# Altium schematic symbol library 6-Connectors 连接器.端子.SchLib: 402 symbols (part 4 of 5) (continued)
## HARTING_16 33 096 1201 000 (continued)

## HARTING_16 79 000 0020 000
designator J?
Quad Length (22.5mm) Stacking Pin For 1x AdvancedMC Basic Side + 2x MCH-Plug Basic Side + 1x Piggyback Connector (Basic Side)
text: Stacking Pin

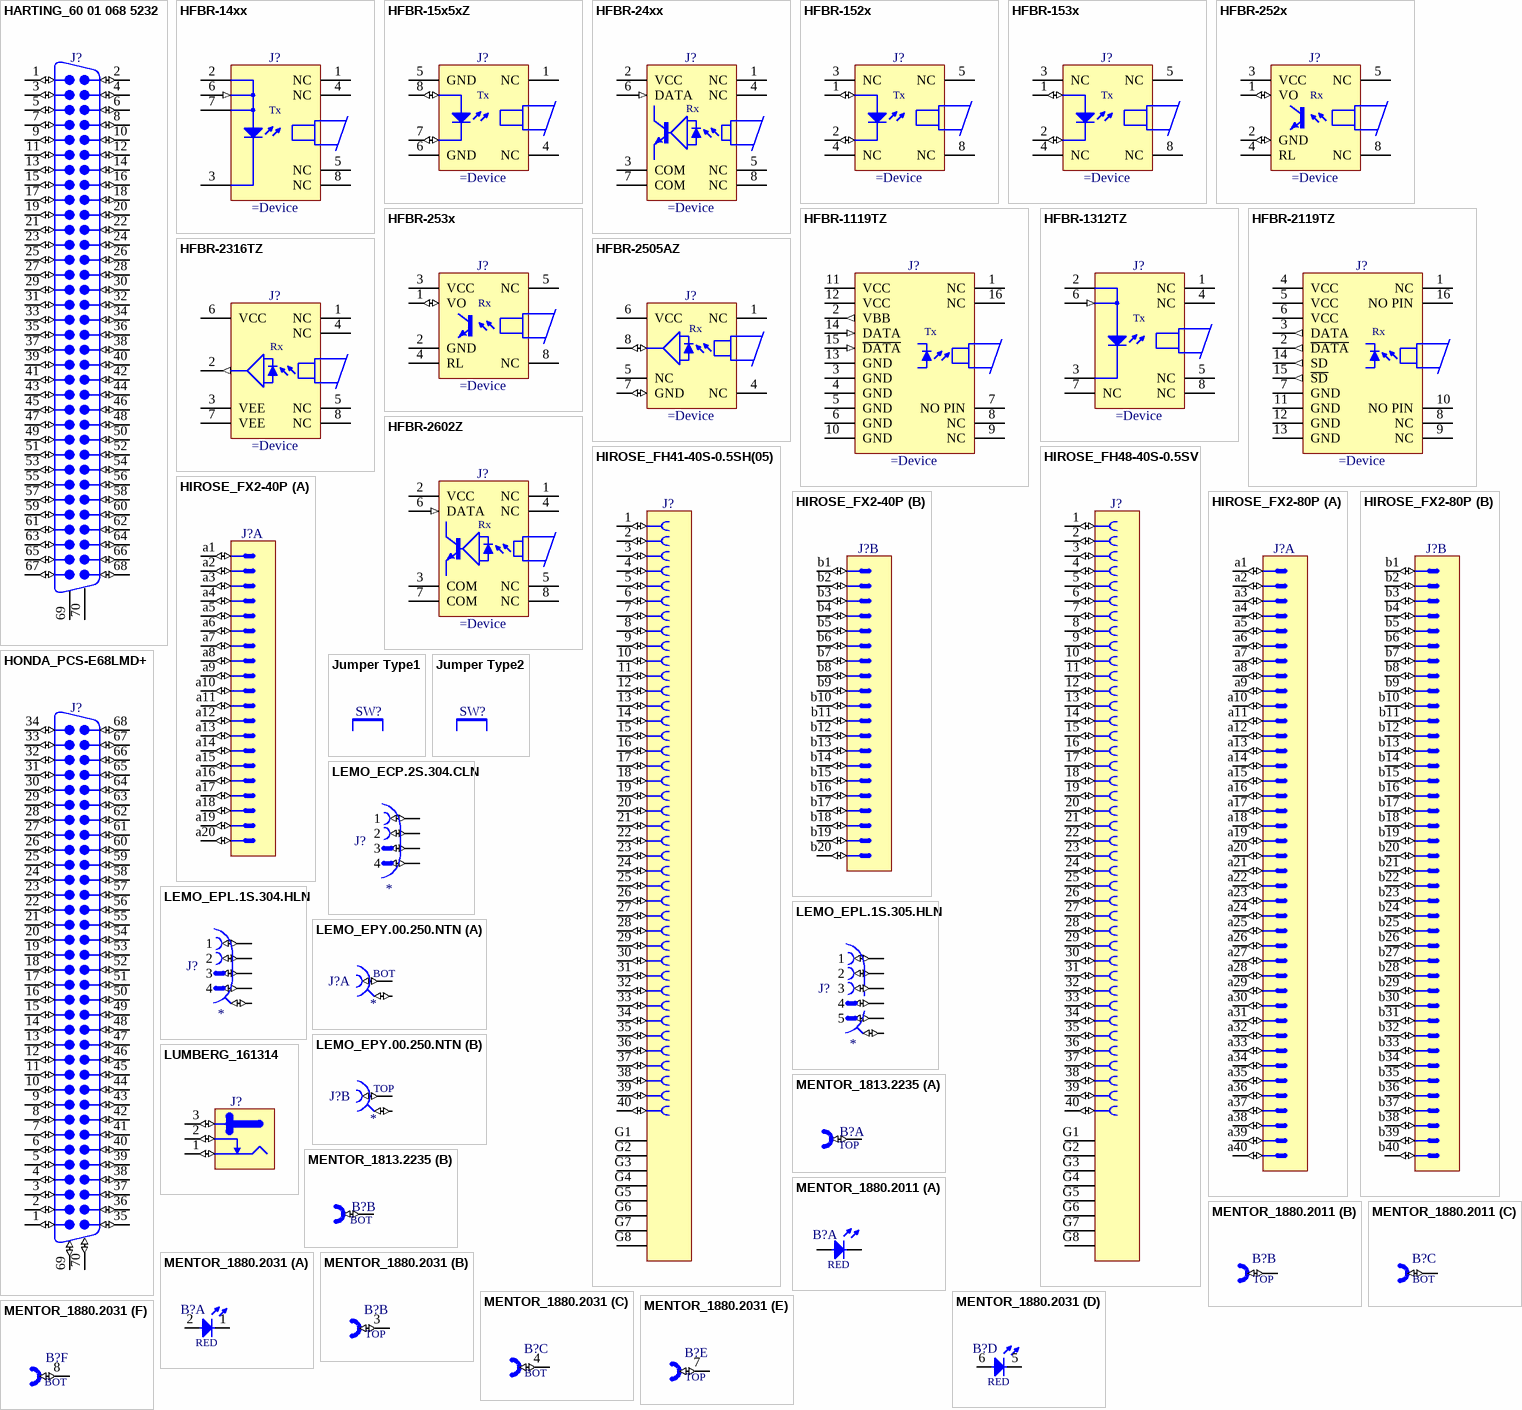
[diagram p38: symbols HARTING_60 01 068 5232 to MENTOR_1880.2031]

## HARTING_60 01 068 5232
designator J?
68 Positions, Right Angle HAR-MIK Male Connector, Panel Fixing M2.5 / PCB Fixing M2.5
pins: 1 (io), 2 (io), 3 (io), 4 (io), 5 (io), 6 (io), 7 (io), 8 (io), 9 (io), 10 (io), 11 (io), 12 (io), 13 (io), 14 (io), 15 (io), 16 (io), 17 (io), 18 (io), 19 (io), 20 (io), 21 (io), 22 (io), 23 (io), 24 (io), 25 (io), 26 (io), 27 (io), 28 (io), 29 (io), 30 (io), 31 (io), 32 (io), 33 (io), 34 (io), 35 (io), 36 (io), 37 (io), 38 (io), 39 (io), 40 (io), 41 (io), 42 (io), 43 (io), 44 (io), 45 (io), 46 (io), 47 (io), 48 (io), 49 (io), 50 (io), 51 (io), 52 (io), 53 (io), 54 (io), 55 (io), 56 (io), 57 (io), 58 (io), 59 (io), 60 (io), 61 (io), 62 (io), 63 (io), 64 (io), 65 (io), 66 (io), 67 (io), 68 (io), 69, 70
1 alternate drawing of the same symbol

## HFBR-14xx
designator J?
HFBR-0400Z Series, Fiber Optic Transmitter
pins: 1 NC, 2 A (power), 3 C (power), 4 NC, 5 NC, 6 A (in), 7 A (power), 8 NC
text: Tx

## HFBR-15x5xZ
designator J?
HFBR-1505xZ, HFBR-1515xZ Series, Fiber Optic Transmitter
pins: 1 NC, 4 NC, 5 GND (power), 6 GND (power), 7 C (io), 8 A (io)
text: Tx

## HFBR-24xx
designator J?
HFBR-0400Z Series, Fiber Optic Receiver
pins: 1 NC, 2 VCC (power), 3 COM (power), 4 NC, 5 NC, 6 DATA (in), 7 COM (power), 8 NC
text: Rx

## HFBR-152x
designator J?
HFBR-0500Z Series, Fiber Optic Transmitter
pins: 1 A (io), 2 C (io), 3 NC, 4 NC, 5 NC, 8 NC
text: Tx

## HFBR-153x
designator J?
HFBR-0500Z Series, Fiber Optic Transmitter
pins: 1 A (io), 2 C (io), 3 NC, 4 NC, 5 NC, 8 NC
text: Tx

## HFBR-252x
designator J?
HFBR-0500Z Series, Fiber Optic Receiver
pins: 1 VO (io), 2 GND (io), 3 VCC (power), 4 RL, 5 NC, 8 NC
text: Rx

## HFBR-253x
designator J?
HFBR-0500Z Series, Fiber Optic Receiver
pins: 1 VO (io), 2 GND (power), 3 VCC (power), 4 RL, 5 NC, 8 NC
text: Rx

## HFBR-1119TZ
designator J?
266MBd, 1300 nm Fiber Optic Transmitter Data Link
pins: 1 NC, 2 VBB (out), 3 GND (power), 4 GND (power), 5 GND (power), 6 GND (power), 7 NO PIN, 8 NC, 9 NC, 10 GND (power), 11 VCC (power), 12 VCC (power), 13 GND (power), 14 DATA (in), 15 ~{DATA} (in), 16 NC
text: Tx

## HFBR-1312TZ
designator J?
HFBR-0300Z Series, 155Mbps, 1300 nm Fiber Optic Transmitter
pins: 1 NC, 2 A (power), 3 C (power), 4 NC, 5 NC, 6 A (in), 7 NC, 8 NC
text: Tx

## HFBR-2119TZ
designator J?
266MBd, 1300 nm Fiber Optic Receiver Data Link
pins: 1 NC, 2 ~{DATA} (out), 3 DATA (out), 4 VCC (power), 5 VCC (power), 6 VCC (power), 7 GND (power), 8 NC, 9 NC, 10 NO PIN, 11 GND (power), 12 GND (power), 13 GND (power), 14 SD (out), 15 ~{SD} (out), 16 NO PIN
text: Rx

## HFBR-2316TZ
designator J?
HFBR-0300Z Series, 155Mbps, 1300 nm Fiber Optic Receiver
pins: 1 NC, 2 SIG (out), 3 VEE (power), 4 NC, 5 NC, 6 VCC (power), 7 VEE (power), 8 NC
text: Rx

## HFBR-2505AZ
designator J?
Fiber Optic Receiver
pins: 1 NC, 4 NC, 5 NC, 6 VCC (power), 7 GND (io), 8 VO (io)
text: Rx

## HFBR-2602Z
designator J?
HFBR-2602Z Fiber Optic Receiver
pins: 1 NC, 2 VCC (power), 3 COM (power), 4 NC, 5 NC, 6 DATA (in), 7 COM (power), 8 NC
text: Rx

## HIROSE_FH41-40S-0.5SH(05)
designator J?
40 Contacts, 0.5mm Pitch, 2.5mm, Horizontal Mounting, High Speed Transmission Connector for Shielded FFC, FH41 Serie
pins: 1 (io), 2 (io), 3 (io), 4 (io), 5 (io), 6 (io), 7 (io), 8 (io), 9 (io), 10 (io), 11 (io), 12 (io), 13 (io), 14 (io), 15 (io), 16 (io), 17 (io), 18 (io), 19 (io), 20 (io), 21 (io), 22 (io), 23 (io), 24 (io), 25 (io), 26 (io), 27 (io), 28 (io), 29 (io), 30 (io), 31 (io), 32 (io), 33 (io), 34 (io), 35 (io), 36 (io), 37 (io), 38 (io), 39 (io), 40 (io), G1 (power), G2 (power), G3 (power), G4 (power), G5 (power), G6 (power), G7 (power), G8 (power)

## HIROSE_FH48-40S-0.5SV
designator J?
40 Contacts, 0.5mm Pitch, 2.5mm, Vertical Mounting, High Speed Transmission Connector for Shielded FFC
pins: 1 (io), 2 (io), 3 (io), 4 (io), 5 (io), 6 (io), 7 (io), 8 (io), 9 (io), 10 (io), 11 (io), 12 (io), 13 (io), 14 (io), 15 (io), 16 (io), 17 (io), 18 (io), 19 (io), 20 (io), 21 (io), 22 (io), 23 (io), 24 (io), 25 (io), 26 (io), 27 (io), 28 (io), 29 (io), 30 (io), 31 (io), 32 (io), 33 (io), 34 (io), 35 (io), 36 (io), 37 (io), 38 (io), 39 (io), 40 (io), G1 (power), G2 (power), G3 (power), G4 (power), G5 (power), G6 (power), G7 (power), G8 (power)

## HIROSE_FX2-40P
designator J?
40 Contacts, 1.27mm Pitch, Board to Board & Mezzanine Header with Prefixed Pin
part A pins: a1 (io), a2 (io), a3 (io), a4 (io), a5 (io), a6 (io), a7 (io), a8 (io), a9 (io), a10 (io), a11 (io), a12 (io), a13 (io), a14 (io), a15 (io), a16 (io), a17 (io), a18 (io), a19 (io), a20 (io)
part B pins: b1 (io), b2 (io), b3 (io), b4 (io), b5 (io), b6 (io), b7 (io), b8 (io), b9 (io), b10 (io), b11 (io), b12 (io), b13 (io), b14 (io), b15 (io), b16 (io), b17 (io), b18 (io), b19 (io), b20 (io)

## HIROSE_FX2-80P
designator J?
80 Contacts, 1.27mm Pitch, Board to Board & Mezzanine Header with Prefixed Pin
part A pins: a1 (io), a2 (io), a3 (io), a4 (io), a5 (io), a6 (io), a7 (io), a8 (io), a9 (io), a10 (io), a11 (io), a12 (io), a13 (io), a14 (io), a15 (io), a16 (io), a17 (io), a18 (io), a19 (io), a20 (io), a21 (io), a22 (io), a23 (io), a24 (io), a25 (io), a26 (io), a27 (io), a28 (io), a29 (io), a30 (io), a31 (io), a32 (io), a33 (io), a34 (io), a35 (io), a36 (io), a37 (io), a38 (io), a39 (io), a40 (io)
part B pins: b1 (io), b2 (io), b3 (io), b4 (io), b5 (io), b6 (io), b7 (io), b8 (io), b9 (io), b10 (io), b11 (io), b12 (io), b13 (io), b14 (io), b15 (io), b16 (io), b17 (io), b18 (io), b19 (io), b20 (io), b21 (io), b22 (io), b23 (io), b24 (io), b25 (io), b26 (io), b27 (io), b28 (io), b29 (io), b30 (io), b31 (io), b32 (io), b33 (io), b34 (io), b35 (io), b36 (io), b37 (io), b38 (io), b39 (io), b40 (io)

## HONDA_PCS-E68LMD+
designator J?
1.27mm Pitch Connector, 68 Male Contacts, Right-Angle, PCS Series
pins: 1 (io), 2 (io), 3 (io), 4 (io), 5 (io), 6 (io), 7 (io), 8 (io), 9 (io), 10 (io), 11 (io), 12 (io), 13 (io), 14 (io), 15 (io), 16 (io), 17 (io), 18 (io), 19 (io), 20 (io), 21 (io), 22 (io), 23 (io), 24 (io), 25 (io), 26 (io), 27 (io), 28 (io), 29 (io), 30 (io), 31 (io), 32 (io), 33 (io), 34 (io), 35 (io), 36 (io), 37 (io), 38 (io), 39 (io), 40 (io), 41 (io), 42 (io), 43 (io), 44 (io), 45 (io), 46 (io), 47 (io), 48 (io), 49 (io), 50 (io), 51 (io), 52 (io), 53 (io), 54 (io), 55 (io), 56 (io), 57 (io), 58 (io), 59 (io), 60 (io), 61 (io), 62 (io), 63 (io), 64 (io), 65 (io), 66 (io), 67 (io), 68 (io), 69 (io), 70 (io)
1 alternate drawing of the same symbol

## Jumper Type1
designator SW?  (value not drawn)
Jumper 1 Pin
pins: 1 (io)

## Jumper Type2
designator SW?  (value not drawn)
Jumper 2 pins
pins: 1 (io), 2 (io)

## LEMO_ECP.2S.304.CLN
designator J?
Coax 2 Female (1-2) + 2 Male (3-4)_No Shield
pins: 1 (io), 2 (io), 3 (io), 4 (io)

## LEMO_EPL.1S.304.HLN
designator J?
Coax 2 Female + 2 Male + 1 Shield
pins: 1 (io), 2 (io), 3 (io), 4 (io), 5 (io)

## LEMO_EPL.1S.305.HLN
designator J?
Coax 3 Female + 2 Male + 1 Shield
pins: 1 (io), 2 (io), 3 (io), 4 (io), 5 (io), 6 (io)

## LEMO_EPY.00.250.NTN
designator J?
Dual Female Coax 1-2 Common Shield 3
part A pins: 1 (io), 3 (io)
part B pins: 2 (io), 3 (io)
part A text: BOT
part B text: TOP

## LUMBERG_161314
designator J?
24V /3. 5A, 2.1mm Diameter Pin, SMD DC Power Supply Connector With  Break Contact
pins: 1 (io), 2 (io), 3 (io)

## MENTOR_1813.2235
designator B?
2 x Right Angled Test Jack 2mm
part A pins: 1 (io)
part B pins: 2 (io)
part A text: TOP
part B text: BOT

## MENTOR_1880.2011
designator B?
2 x TEST JACK 2mm + 1 x RED LED 3mm PCB EDGE MOUNTING
part A pins: 1 C, 2 A
part B pins: 3 (io)
part C pins: 4 (io)
part A text: RED
part B text: TOP
part C text: BOT

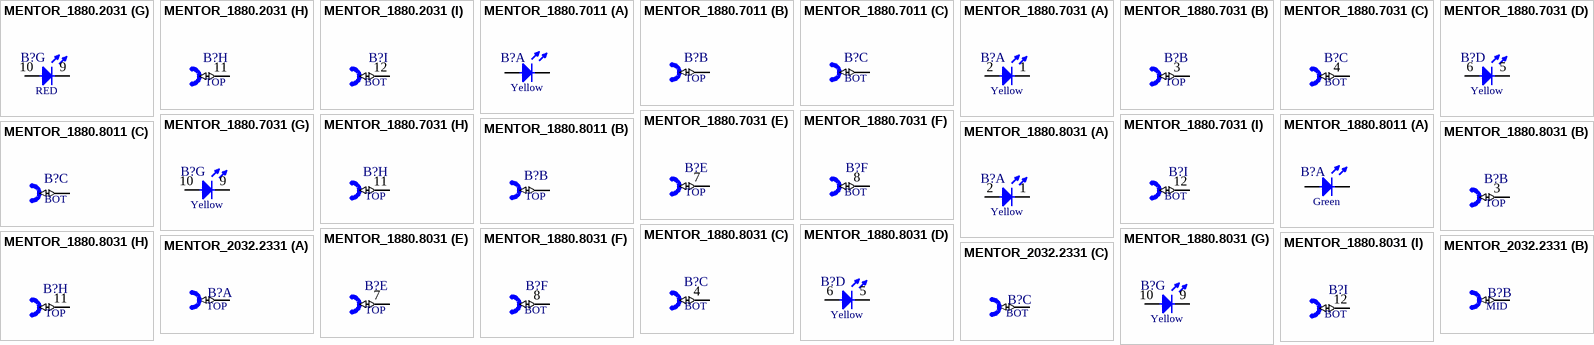
[diagram p39: symbols MENTOR_1880.2031 to MENTOR_2032.2331]

## MENTOR_1880.2031
designator B?
6 x Test JACK 2mm + 3 x Red LED 3mm PCB Edge Mounting
part A pins: 1 C, 2 A
part B pins: 3 (io)
part C pins: 4 (io)
part D pins: 5 C, 6 A
part E pins: 7 (io)
part F pins: 8 (io)
part G pins: 9 C, 10 A
part H pins: 11 (io)
part I pins: 12 (io)
part A text: RED
part B text: TOP
part C text: BOT
part D text: RED
part E text: TOP
part F text: BOT
part G text: RED
part H text: TOP
part I text: BOT

## MENTOR_1880.7011
designator B?
2 x TEST JACK 2mm + 1 x Yellow LED 3mm PCB EDGE MOUNTING
part A pins: 1 C, 2 A
part B pins: 3 (io)
part C pins: 4 (io)
part A text: Yellow
part B text: TOP
part C text: BOT

## MENTOR_1880.7031
designator B?
6 x Test JACK 2mm + 3 x Yellow LED 3mm PCB Edge Mounting
part A pins: 1 C, 2 A
part B pins: 3 (io)
part C pins: 4 (io)
part D pins: 5 C, 6 A
part E pins: 7 (io)
part F pins: 8 (io)
part G pins: 9 C, 10 A
part H pins: 11 (io)
part I pins: 12 (io)
part A text: Yellow
part B text: TOP
part C text: BOT
part D text: Yellow
part E text: TOP
part F text: BOT
part G text: Yellow
part H text: TOP
part I text: BOT

## MENTOR_1880.8011
designator B?
2 x TEST JACK 2mm + 1 x Green LED 3mm PCB EDGE MOUNTING
part A pins: 1 C, 2 A
part B pins: 3 (io)
part C pins: 4 (io)
part A text: Green
part B text: TOP
part C text: BOT

## MENTOR_1880.8031
designator B?
6 x Test JACK 2mm + 3 x Green LED 3mm PCB Edge Mounting
part A pins: 1 C, 2 A
part B pins: 3 (io)
part C pins: 4 (io)
part D pins: 5 C, 6 A
part E pins: 7 (io)
part F pins: 8 (io)
part G pins: 9 C, 10 A
part H pins: 11 (io)
part I pins: 12 (io)
part A text: Yellow
part B text: TOP
part C text: BOT
part D text: Yellow
part E text: TOP
part F text: BOT
part G text: Yellow
part H text: TOP
part I text: BOT

## MENTOR_2032.2331
designator B?
3 x Right Angled Test Jack 2mm
part A pins: 1 (io)
part B pins: 2 (io)
part C pins: 3 (io)
part A text: TOP
part B text: MID
part C text: BOT

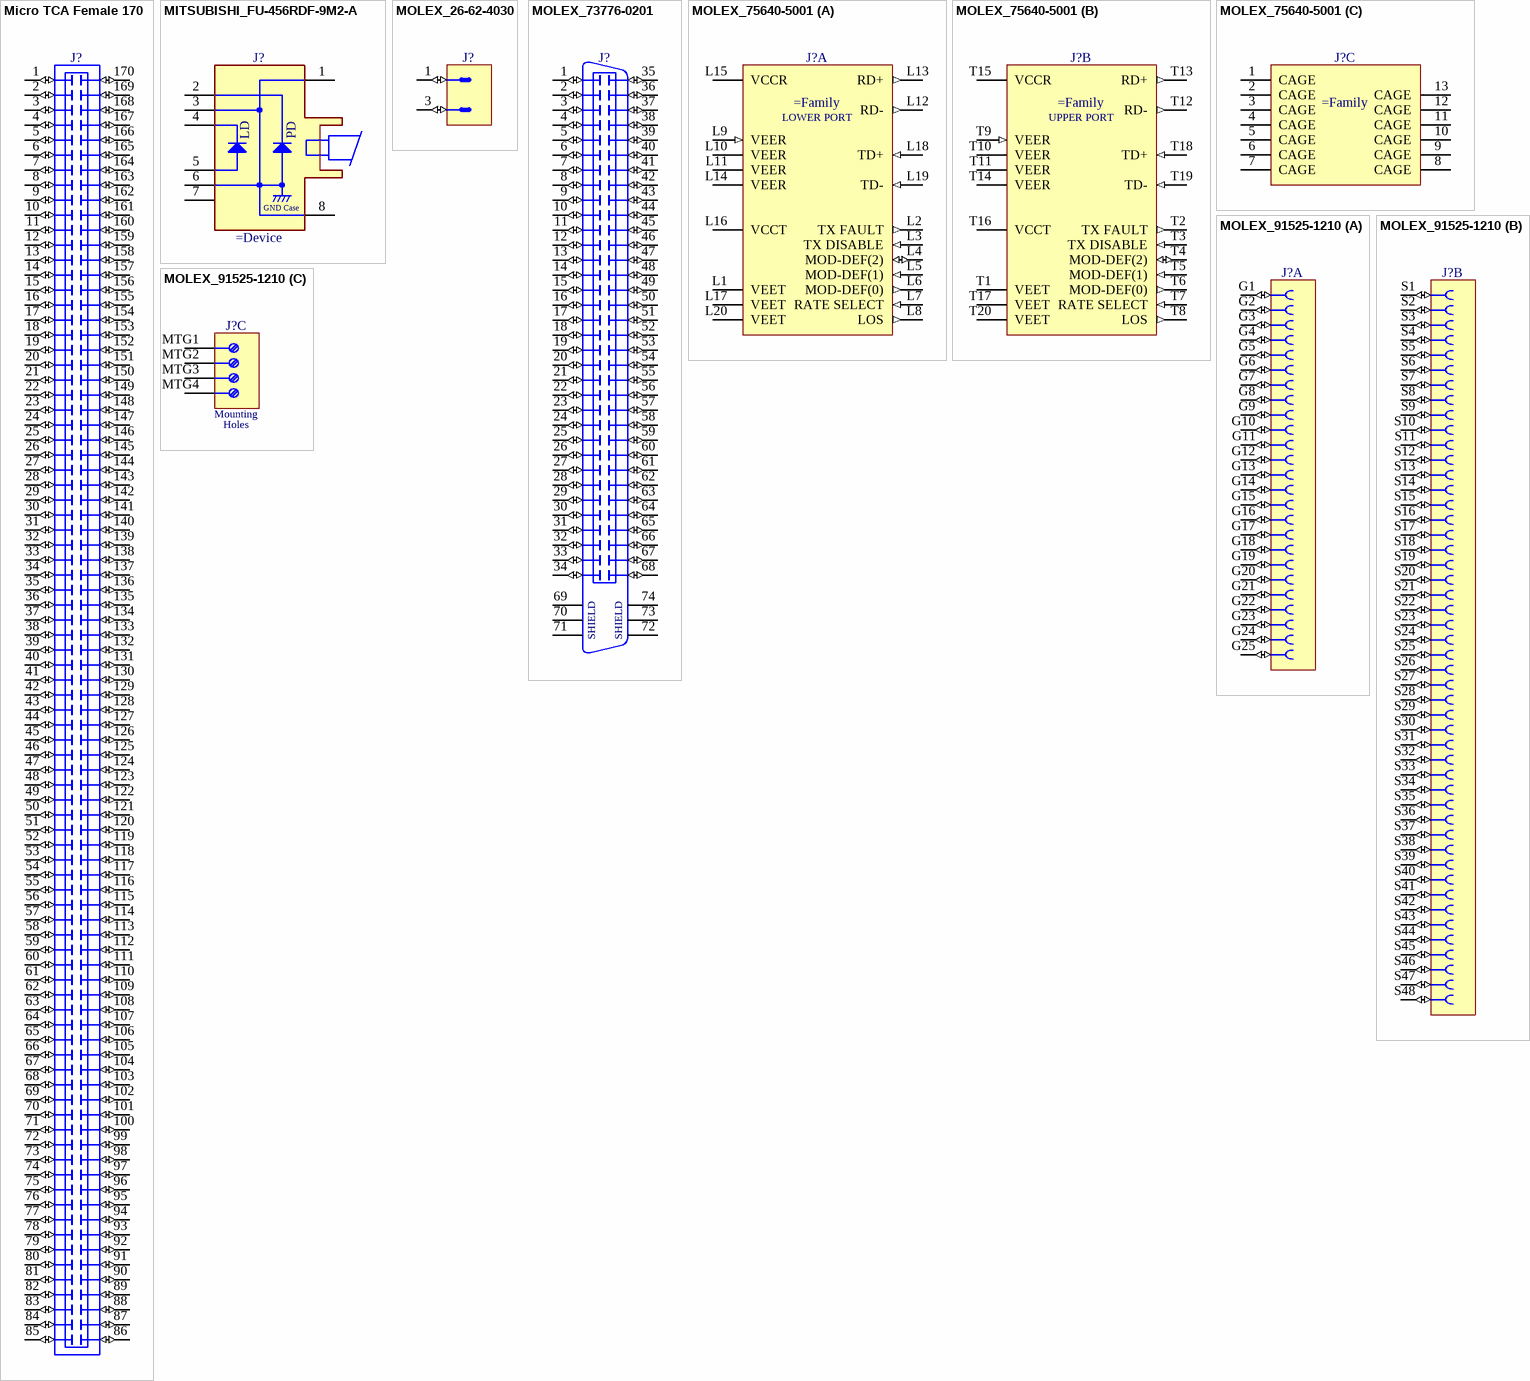
[diagram p40: symbols Micro TCA Female 170 to MOLEX_91525-1210]

## Micro TCA Female 170
designator J?
170 Poles,  Micro TCA (Telecom Computing Architecture) Edge Card Socket
pins: 1 (io), 2 (io), 3 (io), 4 (io), 5 (io), 6 (io), 7 (io), 8 (io), 9 (io), 10 (io), 11 (io), 12 (io), 13 (io), 14 (io), 15 (io), 16 (io), 17 (io), 18 (io), 19 (io), 20 (io), 21 (io), 22 (io), 23 (io), 24 (io), 25 (io), 26 (io), 27 (io), 28 (io), 29 (io), 30 (io), 31 (io), 32 (io), 33 (io), 34 (io), 35 (io), 36 (io), 37 (io), 38 (io), 39 (io), 40 (io), 41 (io), 42 (io), 43 (io), 44 (io), 45 (io), 46 (io), 47 (io), 48 (io), 49 (io), 50 (io), 51 (io), 52 (io), 53 (io), 54 (io), 55 (io), 56 (io), 57 (io), 58 (io), 59 (io), 60 (io), 61 (io), 62 (io), 63 (io), 64 (io), 65 (io), 66 (io), 67 (io), 68 (io), 69 (io), 70 (io), 71 (io), 72 (io), 73 (io), 74 (io), 75 (io), 76 (io), 77 (io), 78 (io), 79 (io), 80 (io), 81 (io), 82 (io), 83 (io), 84 (io), 85 (io), 86 (io), 87 (io), 88 (io), 89 (io), 90 (io), 91 (io), 92 (io), 93 (io), 94 (io), 95 (io), 96 (io), 97 (io), 98 (io), 99 (io), 100 (io), 101 (io), 102 (io), 103 (io), 104 (io), 105 (io), 106 (io), 107 (io), 108 (io), 109 (io), 110 (io), 111 (io), 112 (io), 113 (io), 114 (io), 115 (io), 116 (io), 117 (io), 118 (io), 119 (io), 120 (io), 121 (io), 122 (io), 123 (io), 124 (io), 125 (io), 126 (io), 127 (io), 128 (io), 129 (io), 130 (io), 131 (io), 132 (io), 133 (io), 134 (io), 135 (io), 136 (io), 137 (io), 138 (io), 139 (io), 140 (io), 141 (io), 142 (io), 143 (io), 144 (io), 145 (io), 146 (io), 147 (io), 148 (io), 149 (io), 150 (io), 151 (io), 152 (io), 153 (io), 154 (io), 155 (io), 156 (io), 157 (io), 158 (io), 159 (io), 160 (io), 161 (io), 162 (io), 163 (io), 164 (io), 165 (io), 166 (io), 167 (io), 168 (io), 169 (io), 170 (io)

## MITSUBISHI_FU-456RDF-9M2-A
designator J?
10Gbps DFB-LD Transmitter Optical Sub Assembly (TOSA) Laser Modules
pins: 1, 2, 3, 4, 5, 6, 7, 8
text: LD; PD; GND Case

## MOLEX_26-62-4030
designator J?
Connector 3 Male Without Contact Number 2, MOLEX Serie KK
pins: 1 (io), 3 (io)
1 alternate drawing of the same symbol

## MOLEX_73776-0201
designator J?
0.80mm Pitch, 68 Contacts, Ultra+ VHDCI Surface Mount Vertical Receptacle
pins: 1 (io), 2 (io), 3 (io), 4 (io), 5 (io), 6 (io), 7 (io), 8 (io), 9 (io), 10 (io), 11 (io), 12 (io), 13 (io), 14 (io), 15 (io), 16 (io), 17 (io), 18 (io), 19 (io), 20 (io), 21 (io), 22 (io), 23 (io), 24 (io), 25 (io), 26 (io), 27 (io), 28 (io), 29 (io), 30 (io), 31 (io), 32 (io), 33 (io), 34 (io), 35 (io), 36 (io), 37 (io), 38 (io), 39 (io), 40 (io), 41 (io), 42 (io), 43 (io), 44 (io), 45 (io), 46 (io), 47 (io), 48 (io), 49 (io), 50 (io), 51 (io), 52 (io), 53 (io), 54 (io), 55 (io), 56 (io), 57 (io), 58 (io), 59 (io), 60 (io), 61 (io), 62 (io), 63 (io), 64 (io), 65 (io), 66 (io), 67 (io), 68 (io), 69, 70, 71, 72, 73, 74
text: SHIELD

## MOLEX_75640-5001
designator J?
Dual 20 Positions Stacked SFP (Small Form-factor Pluggable) Receptacles with 4 Light Pipes, Medium Height Assembly, Press Fit Tails
part A pins: L1 VEET (power), L2 TX FAULT (out), L3 TX DISABLE (in), L4 MOD-DEF(2) (io), L5 MOD-DEF(1) (in), L6 MOD-DEF(0) (out), L7 RATE SELECT (in), L8 LOS (out), L9 VEER (in), L10 VEER (power), L11 VEER (power), L12 RD- (out), L13 RD+ (out), L14 VEER (power), L15 VCCR (power), L16 VCCT (power), L17 VEET (power), L18 TD+ (in), L19 TD- (in), L20 VEET (power)
part B pins: T1 VEET (power), T2 TX FAULT (out), T3 TX DISABLE (in), T4 MOD-DEF(2) (io), T5 MOD-DEF(1) (in), T6 MOD-DEF(0) (out), T7 RATE SELECT (in), T8 LOS (out), T9 VEER (in), T10 VEER (power), T11 VEER (power), T12 RD- (out), T13 RD+ (out), T14 VEER (power), T15 VCCR (power), T16 VCCT (power), T17 VEET (power), T18 TD+ (in), T19 TD- (in), T20 VEET (power)
part C pins: 1 CAGE (power), 2 CAGE (power), 3 CAGE (power), 4 CAGE (power), 5 CAGE (power), 6 CAGE (power), 7 CAGE (power), 8 CAGE (power), 9 CAGE (power), 10 CAGE (power), 11 CAGE (power), 12 CAGE (power), 13 CAGE (power)
part A text: LOWER PORT
part B text: UPPER PORT

## MOLEX_91525-1210
designator J?
LaneLink I/O Latch Receptacle, 12 Lane, Cx4 Ethernet, 24 Circuits, 2 Screw Holes
part A pins: G1 (io), G2 (io), G3 (io), G4 (io), G5 (io), G6 (io), G7 (io), G8 (io), G9 (io), G10 (io), G11 (io), G12 (io), G13 (io), G14 (io), G15 (io), G16 (io), G17 (io), G18 (io), G19 (io), G20 (io), G21 (io), G22 (io), G23 (io), G24 (io), G25 (io)
part B pins: S1 (io), S2 (io), S3 (io), S4 (io), S5 (io), S6 (io), S7 (io), S8 (io), S9 (io), S10 (io), S11 (io), S12 (io), S13 (io), S14 (io), S15 (io), S16 (io), S17 (io), S18 (io), S19 (io), S20 (io), S21 (io), S22 (io), S23 (io), S24 (io), S25 (io), S26 (io), S27 (io), S28 (io), S29 (io), S30 (io), S31 (io), S32 (io), S33 (io), S34 (io), S35 (io), S36 (io), S37 (io), S38 (io), S39 (io), S40 (io), S41 (io), S42 (io), S43 (io), S44 (io), S45 (io), S46 (io), S47 (io), S48 (io)
part C pins: MTG1, MTG2, MTG3, MTG4
part C text: Mounting; Holes

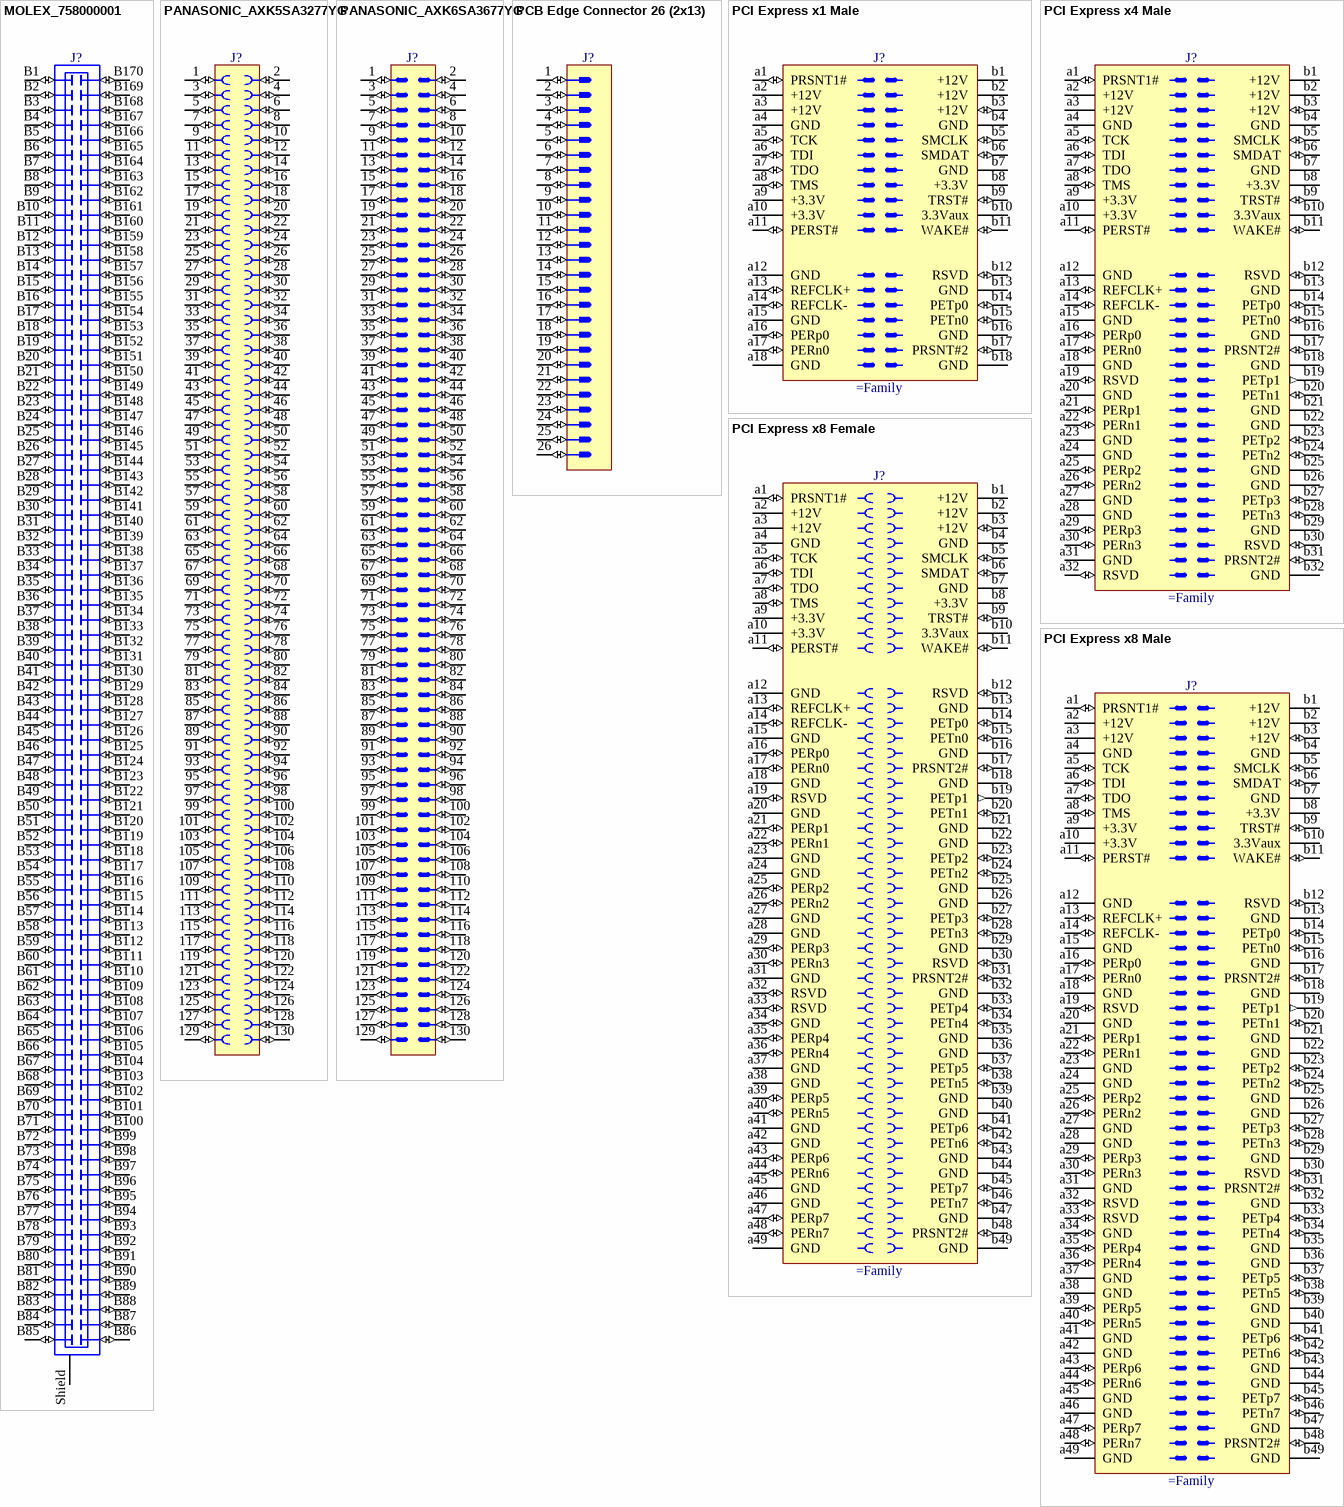
[diagram p41: symbols MOLEX_758000001 to PCI Express x8 Male]

## MOLEX_758000001
designator J?
Advanced Mezzanine Card Connector, AMC B+ Style, 170 Circuit
pins: B1 (io), B2 (io), B3 (io), B4 (io), B5 (io), B6 (io), B7 (io), B8 (io), B9 (io), B10 (io), B11 (io), B12 (io), B13 (io), B14 (io), B15 (io), B16 (io), B17 (io), B18 (io), B19 (io), B20 (io), B21 (io), B22 (io), B23 (io), B24 (io), B25 (io), B26 (io), B27 (io), B28 (io), B29 (io), B30 (io), B31 (io), B32 (io), B33 (io), B34 (io), B35 (io), B36 (io), B37 (io), B38 (io), B39 (io), B40 (io), B41 (io), B42 (io), B43 (io), B44 (io), B45 (io), B46 (io), B47 (io), B48 (io), B49 (io), B50 (io), B51 (io), B52 (io), B53 (io), B54 (io), B55 (io), B56 (io), B57 (io), B58 (io), B59 (io), B60 (io), B61 (io), B62 (io), B63 (io), B64 (io), B65 (io), B66 (io), B67 (io), B68 (io), B69 (io), B70 (io), B71 (io), B72 (io), B73 (io), B74 (io), B75 (io), B76 (io), B77 (io), B78 (io), B79 (io), B80 (io), B81 (io), B82 (io), B83 (io), B84 (io), B85 (io), B86 (io), B87 (io), B88 (io), B89 (io), B90 (io), B91 (io), B92 (io), B93 (io), B94 (io), B95 (io), B96 (io), B97 (io), B98 (io), B99 (io), B100 (io), B101 (io), B102 (io), B103 (io), B104 (io), B105 (io), B106 (io), B107 (io), B108 (io), B109 (io), B110 (io), B111 (io), B112 (io), B113 (io), B114 (io), B115 (io), B116 (io), B117 (io), B118 (io), B119 (io), B120 (io), B121 (io), B122 (io), B123 (io), B124 (io), B125 (io), B126 (io), B127 (io), B128 (io), B129 (io), B130 (io), B131 (io), B132 (io), B133 (io), B134 (io), B135 (io), B136 (io), B137 (io), B138 (io), B139 (io), B140 (io), B141 (io), B142 (io), B143 (io), B144 (io), B145 (io), B146 (io), B147 (io), B148 (io), B149 (io), B150 (io), B151 (io), B152 (io), B153 (io), B154 (io), B155 (io), B156 (io), B157 (io), B158 (io), B159 (io), B160 (io), B161 (io), B162 (io), B163 (io), B164 (io), B165 (io), B166 (io), B167 (io), B168 (io), B169 (io), B170 (io), Shield

## PANASONIC_AXK5SA3277YG
designator J?
130 Contacts Socket PANASONIC P5KS Serie
pins: 1 (io), 2 (io), 3 (io), 4 (io), 5 (io), 6 (io), 7 (io), 8 (io), 9 (io), 10 (io), 11 (io), 12 (io), 13 (io), 14 (io), 15 (io), 16 (io), 17 (io), 18 (io), 19 (io), 20 (io), 21 (io), 22 (io), 23 (io), 24 (io), 25 (io), 26 (io), 27 (io), 28 (io), 29 (io), 30 (io), 31 (io), 32 (io), 33 (io), 34 (io), 35 (io), 36 (io), 37 (io), 38 (io), 39 (io), 40 (io), 41 (io), 42 (io), 43 (io), 44 (io), 45 (io), 46 (io), 47 (io), 48 (io), 49 (io), 50 (io), 51 (io), 52 (io), 53 (io), 54 (io), 55 (io), 56 (io), 57 (io), 58 (io), 59 (io), 60 (io), 61 (io), 62 (io), 63 (io), 64 (io), 65 (io), 66 (io), 67 (io), 68 (io), 69 (io), 70 (io), 71 (io), 72 (io), 73 (io), 74 (io), 75 (io), 76 (io), 77 (io), 78 (io), 79 (io), 80 (io), 81 (io), 82 (io), 83 (io), 84 (io), 85 (io), 86 (io), 87 (io), 88 (io), 89 (io), 90 (io), 91 (io), 92 (io), 93 (io), 94 (io), 95 (io), 96 (io), 97 (io), 98 (io), 99 (io), 100 (io), 101 (io), 102 (io), 103 (io), 104 (io), 105 (io), 106 (io), 107 (io), 108 (io), 109 (io), 110 (io), 111 (io), 112 (io), 113 (io), 114 (io), 115 (io), 116 (io), 117 (io), 118 (io), 119 (io), 120 (io), 121 (io), 122 (io), 123 (io), 124 (io), 125 (io), 126 (io), 127 (io), 128 (io), 129 (io), 130 (io)

## PANASONIC_AXK6SA3677YG
designator J?
130 Contacts Header PANASONIC AXK6S Serie
pins: 1 (io), 2 (io), 3 (io), 4 (io), 5 (io), 6 (io), 7 (io), 8 (io), 9 (io), 10 (io), 11 (io), 12 (io), 13 (io), 14 (io), 15 (io), 16 (io), 17 (io), 18 (io), 19 (io), 20 (io), 21 (io), 22 (io), 23 (io), 24 (io), 25 (io), 26 (io), 27 (io), 28 (io), 29 (io), 30 (io), 31 (io), 32 (io), 33 (io), 34 (io), 35 (io), 36 (io), 37 (io), 38 (io), 39 (io), 40 (io), 41 (io), 42 (io), 43 (io), 44 (io), 45 (io), 46 (io), 47 (io), 48 (io), 49 (io), 50 (io), 51 (io), 52 (io), 53 (io), 54 (io), 55 (io), 56 (io), 57 (io), 58 (io), 59 (io), 60 (io), 61 (io), 62 (io), 63 (io), 64 (io), 65 (io), 66 (io), 67 (io), 68 (io), 69 (io), 70 (io), 71 (io), 72 (io), 73 (io), 74 (io), 75 (io), 76 (io), 77 (io), 78 (io), 79 (io), 80 (io), 81 (io), 82 (io), 83 (io), 84 (io), 85 (io), 86 (io), 87 (io), 88 (io), 89 (io), 90 (io), 91 (io), 92 (io), 93 (io), 94 (io), 95 (io), 96 (io), 97 (io), 98 (io), 99 (io), 100 (io), 101 (io), 102 (io), 103 (io), 104 (io), 105 (io), 106 (io), 107 (io), 108 (io), 109 (io), 110 (io), 111 (io), 112 (io), 113 (io), 114 (io), 115 (io), 116 (io), 117 (io), 118 (io), 119 (io), 120 (io), 121 (io), 122 (io), 123 (io), 124 (io), 125 (io), 126 (io), 127 (io), 128 (io), 129 (io), 130 (io)

## PCB Edge Connector 26 (2x13)
designator J?
PCB Edge Connector 26 (2x13)
pins: 1 (io), 2 (io), 3 (io), 4 (io), 5 (io), 6 (io), 7 (io), 8 (io), 9 (io), 10 (io), 11 (io), 12 (io), 13 (io), 14 (io), 15 (io), 16 (io), 17 (io), 18 (io), 19 (io), 20 (io), 21 (io), 22 (io), 23 (io), 24 (io), 25 (io), 26 (io)
1 alternate drawing of the same symbol

## PCI Express x1 Male
designator J?
36 contacts Board Eddge PCI Express x1 Connector
pins: a1 PRSNT1# (io), a2 +12V (power), a3 +12V (power), a4 GND (power), a5 TCK (io), a6 TDI (io), a7 TDO (io), a8 TMS (io), a9 +3.3V (power), a10 +3.3V (power), a11 PERST# (io), a12 GND (power), a13 REFCLK+ (io), a14 REFCLK- (io), a15 GND (power), a16 PERp0 (io), a17 PERn0 (io), a18 GND (power), b1 +12V (power), b2 +12V (power), b3 +12V (io), b4 GND (power), b5 SMCLK (io), b6 SMDAT (io), b7 GND (power), b8 +3.3V (power), b9 TRST# (io), b10 3.3Vaux (power), b11 WAKE# (io), b12 RSVD (io), b13 GND (power), b14 PETp0 (io), b15 PETn0 (io), b16 GND (power), b17 PRSNT#2 (io), b18 GND (power)

## PCI Express x4 Male
designator J?
64 contacts Board Eddge PCI Express x4 Connector
pins: a1 PRSNT1# (io), a2 +12V (power), a3 +12V (power), a4 GND (power), a5 TCK (io), a6 TDI (io), a7 TDO (io), a8 TMS (io), a9 +3.3V (power), a10 +3.3V (power), a11 PERST# (io), a12 GND (power), a13 REFCLK+ (io), a14 REFCLK- (io), a15 GND (power), a16 PERp0 (io), a17 PERn0 (io), a18 GND (power), a19 RSVD (io), a20 GND (power), a21 PERp1 (io), a22 PERn1 (io), a23 GND (power), a24 GND (power), a25 PERp2 (io), a26 PERn2 (io), a27 GND (power), a28 GND (power), a29 PERp3 (io), a30 PERn3 (io), a31 GND (power), a32 RSVD (io), b1 +12V (power), b2 +12V (power), b3 +12V (io), b4 GND (power), b5 SMCLK (io), b6 SMDAT (io), b7 GND (power), b8 +3.3V (power), b9 TRST# (io), b10 3.3Vaux (power), b11 WAKE# (io), b12 RSVD (io), b13 GND (power), b14 PETp0 (io), b15 PETn0 (io), b16 GND (power), b17 PRSNT2# (io), b18 GND (power), b19 PETp1 (out), b20 PETn1 (io), b21 GND (power), b22 GND (power), b23 PETp2 (io), b24 PETn2 (io), b25 GND (power), b26 GND (power), b27 PETp3 (io), b28 PETn3 (io), b29 GND (power), b30 RSVD (io), b31 PRSNT2# (io), b32 GND (power)

## PCI Express x8 Female
designator J?
98 contacts Board Eddge PCI Express x8 Connector
pins: a1 PRSNT1# (io), a2 +12V (power), a3 +12V (power), a4 GND (power), a5 TCK (io), a6 TDI (io), a7 TDO (io), a8 TMS (io), a9 +3.3V (power), a10 +3.3V (power), a11 PERST# (io), a12 GND (power), a13 REFCLK+ (io), a14 REFCLK- (io), a15 GND (power), a16 PERp0 (io), a17 PERn0 (io), a18 GND (power), a19 RSVD (io), a20 GND (power), a21 PERp1 (io), a22 PERn1 (io), a23 GND (power), a24 GND (power), a25 PERp2 (io), a26 PERn2 (io), a27 GND (power), a28 GND (power), a29 PERp3 (io), a30 PERn3 (io), a31 GND (power), a32 RSVD (io), a33 RSVD (io), a34 GND (io), a35 PERp4 (io), a36 PERn4 (io), a37 GND (power), a38 GND (power), a39 PERp5 (io), a40 PERn5 (io), a41 GND (power), a42 GND (power), a43 PERp6 (io), a44 PERn6 (io), a45 GND (power), a46 GND (power), a47 PERp7 (io), a48 PERn7 (io), a49 GND (power), b1 +12V (power), b2 +12V (power), b3 +12V (io), b4 GND (power), b5 SMCLK (io), b6 SMDAT (io), b7 GND (power), b8 +3.3V (power), b9 TRST# (io), b10 3.3Vaux (power), b11 WAKE# (io), b12 RSVD (io), b13 GND (power), b14 PETp0 (io), b15 PETn0 (io), b16 GND (power), b17 PRSNT2# (io), b18 GND (power), b19 PETp1 (out), b20 PETn1 (io), b21 GND (power), b22 GND (power), b23 PETp2 (io), b24 PETn2 (io), b25 GND (power), b26 GND (power), b27 PETp3 (io), b28 PETn3 (io), b29 GND (power), b30 RSVD (io), b31 PRSNT2# (io), b32 GND (power), b33 PETp4 (io), b34 PETn4 (io), b35 GND (power), b36 GND (power), b37 PETp5 (io), b38 PETn5 (io), b39 GND (power), b40 GND (power), b41 PETp6 (io), b42 PETn6 (io), b43 GND (power), b44 GND (power), b45 PETp7 (io), b46 PETn7 (io), b47 GND (power), b48 PRSNT2# (io), b49 GND (power)

## PCI Express x8 Male
designator J?
98 contacts Board Eddge PCI Express x8 Connector
pins: a1 PRSNT1# (io), a2 +12V (power), a3 +12V (power), a4 GND (power), a5 TCK (io), a6 TDI (io), a7 TDO (io), a8 TMS (io), a9 +3.3V (power), a10 +3.3V (power), a11 PERST# (io), a12 GND (power), a13 REFCLK+ (io), a14 REFCLK- (io), a15 GND (power), a16 PERp0 (io), a17 PERn0 (io), a18 GND (power), a19 RSVD (io), a20 GND (power), a21 PERp1 (io), a22 PERn1 (io), a23 GND (power), a24 GND (power), a25 PERp2 (io), a26 PERn2 (io), a27 GND (power), a28 GND (power), a29 PERp3 (io), a30 PERn3 (io), a31 GND (power), a32 RSVD (io), a33 RSVD (io), a34 GND (io), a35 PERp4 (io), a36 PERn4 (io), a37 GND (power), a38 GND (power), a39 PERp5 (io), a40 PERn5 (io), a41 GND (power), a42 GND (power), a43 PERp6 (io), a44 PERn6 (io), a45 GND (power), a46 GND (power), a47 PERp7 (io), a48 PERn7 (io), a49 GND (power), b1 +12V (power), b2 +12V (power), b3 +12V (io), b4 GND (power), b5 SMCLK (io), b6 SMDAT (io), b7 GND (power), b8 +3.3V (power), b9 TRST# (io), b10 3.3Vaux (power), b11 WAKE# (io), b12 RSVD (io), b13 GND (power), b14 PETp0 (io), b15 PETn0 (io), b16 GND (power), b17 PRSNT2# (io), b18 GND (power), b19 PETp1 (out), b20 PETn1 (io), b21 GND (power), b22 GND (power), b23 PETp2 (io), b24 PETn2 (io), b25 GND (power), b26 GND (power), b27 PETp3 (io), b28 PETn3 (io), b29 GND (power), b30 RSVD (io), b31 PRSNT2# (io), b32 GND (power), b33 PETp4 (io), b34 PETn4 (io), b35 GND (power), b36 GND (power), b37 PETp5 (io), b38 PETn5 (io), b39 GND (power), b40 GND (power), b41 PETp6 (io), b42 PETn6 (io), b43 GND (power), b44 GND (power), b45 PETp7 (io), b46 PETn7 (io), b47 GND (power), b48 PRSNT2# (io), b49 GND (power)

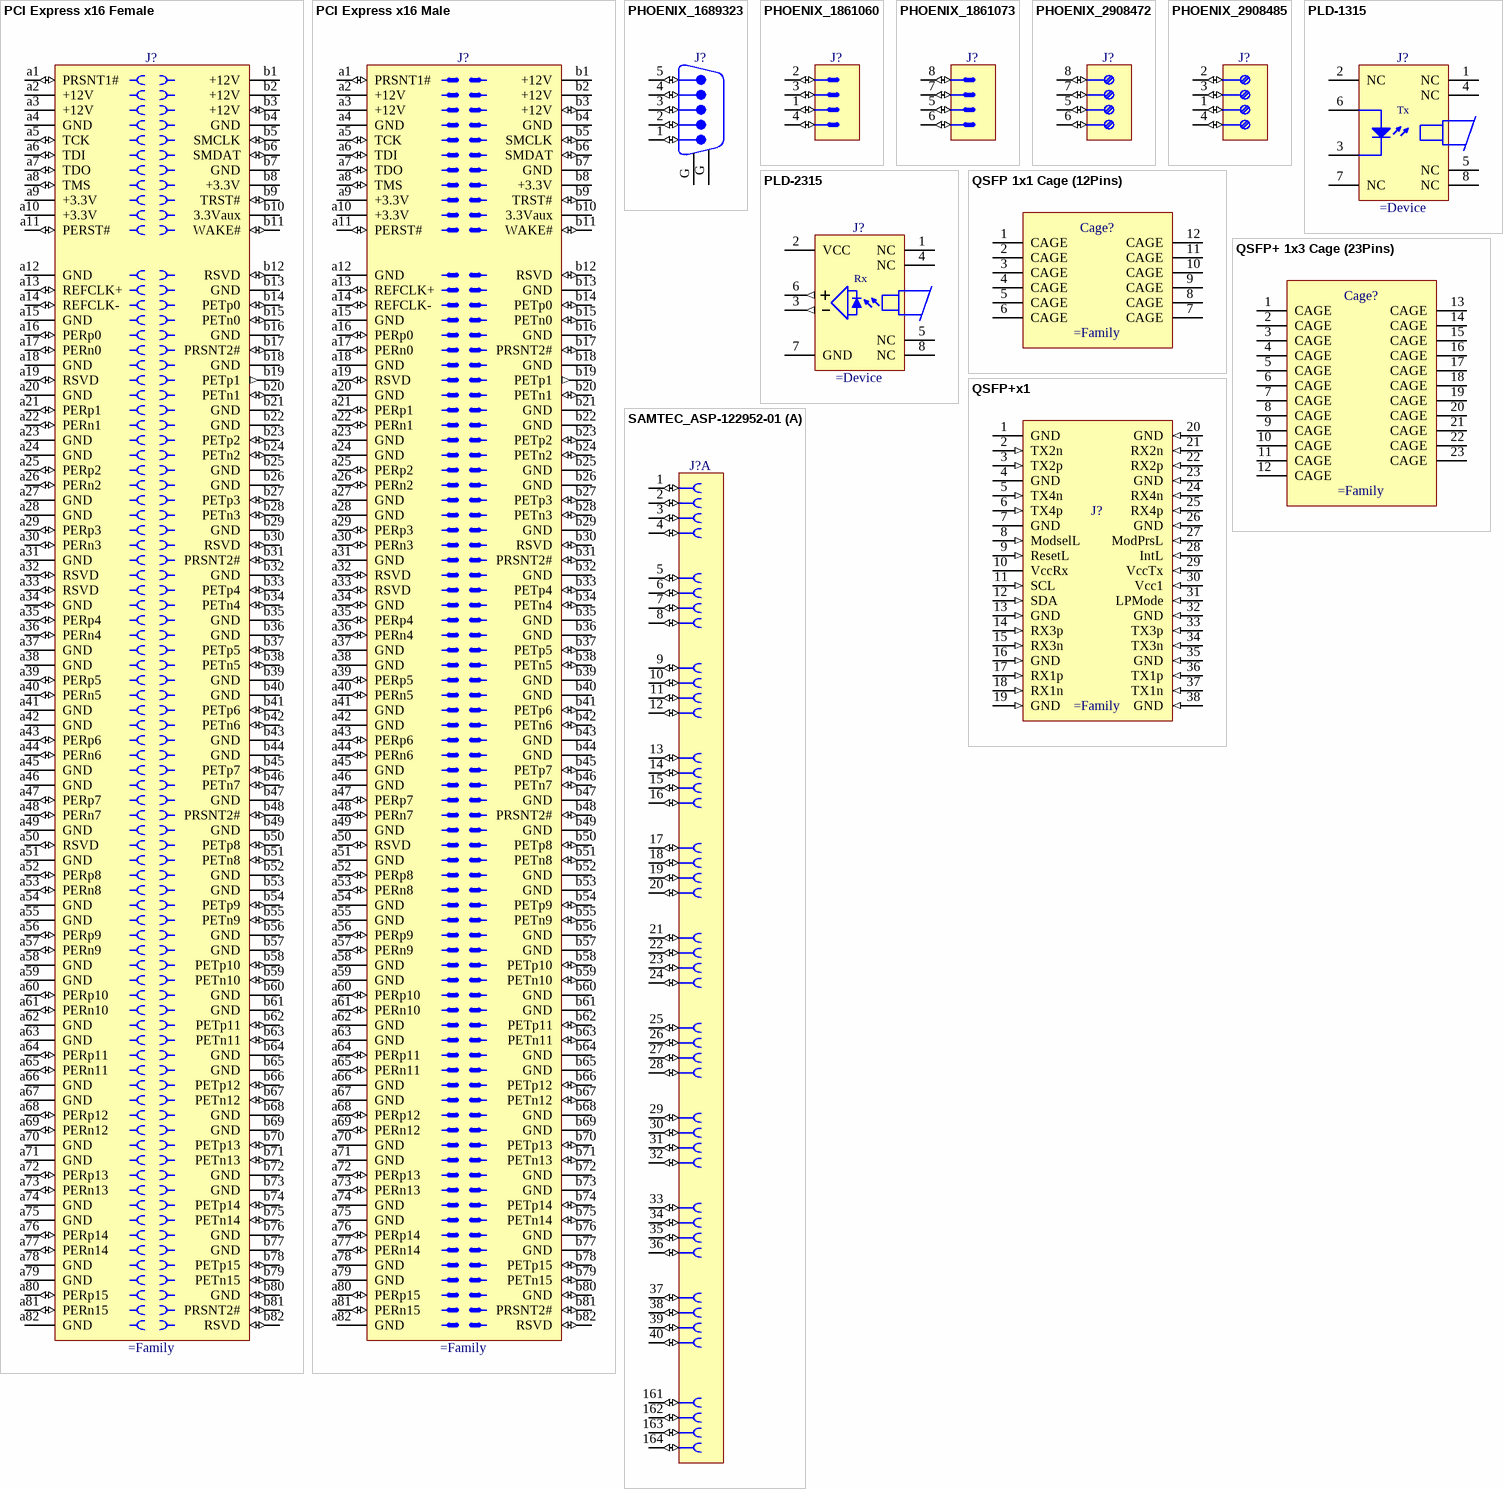
[diagram p42: symbols PCI Express x16 Female to SAMTEC_ASP-122952-01]